# Altium footprint library Footprint.PcbLib: 137 footprints (part 1 of 9)
Each footprint in its own frame and in the unit in brackets; x right, y up, seen from the top. Pads: shape width x height; smd on the part's side, far side on the other; paste and mask are expansions set on the pad; w line width, h text height; cw(c..) or ccw(c..) is an arc to the next point about the centre after c.
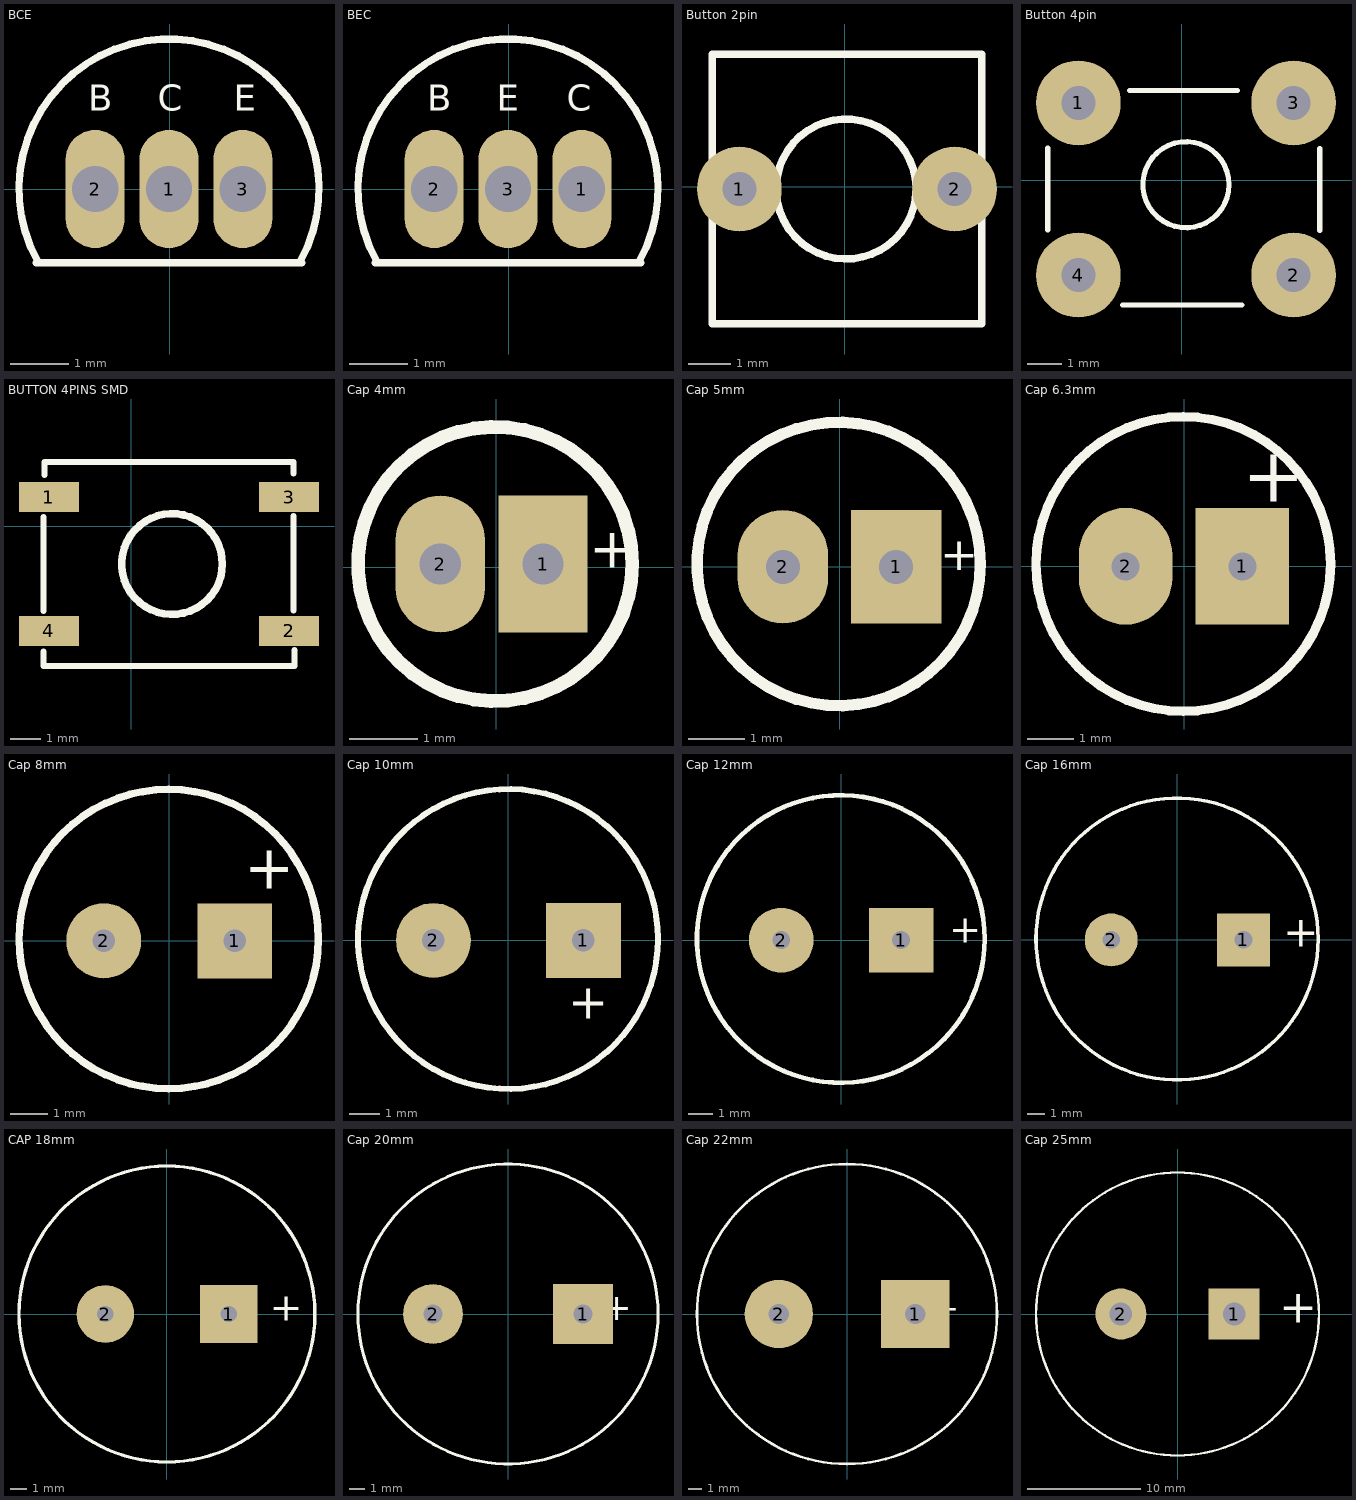
[diagram p0: the footprints below, top view; thin cyan lines are the x and y axes]

## BCE [mil] "Transistor BCE"
pads (3):
  oval 40x80 hole 31.49 unplated: 1(-0.39,0) 2(-50.39,0) 3(49.61,0)
Top Overlay:
  lines w5: -90.39,-50 89.61,-50 ; -89.34,-49.1 cw(c-0.39,0) 88.55,-49.1
  text "E" at 43.31,47.24 h30
  text "B" at -55.12,47.24 h30
  text "C" at -7.87,47.24 h30
3D body: height 196.85, standoff -39.37, extent -64.37,-10.78 -40.79,12.75
3D body: height 196.85, standoff -39.37, extent -13.19,-11.76 10.39,11.76
3D body: height 196.85, standoff -39.37, extent 36.02,-10.78 59.6,12.75
3D body: height 314.96, standoff 157.48, extent -89.96,-48.23 87.2,89.57

## BEC [mil] "Transistor BEC"
pads (3):
  oval 40x80 hole 31.49 unplated: 1(49.61,0) 2(-50.39,0) 3(-0.39,0)
Top Overlay:
  lines w5: -90.39,-50 89.61,-50 ; -89.34,-49.1 cw(c-0.39,0) 88.55,-49.1
  text "C" at 39.37,47.24 h30
  text "B" at -55.12,47.24 h30
  text "E" at -7.87,47.24 h30
3D body: height 314.96, standoff 157.48, extent -89.96,-48.23 87.2,89.57
3D body: height 196.85, standoff -39.37, extent 36.02,-10.78 59.6,12.75
3D body: height 196.85, standoff -39.37, extent -13.19,-11.76 10.39,11.76
3D body: height 196.85, standoff -39.37, extent -64.37,-10.78 -40.79,12.75

## Button 2pin [mm] "nut nhan 2pin"
pads (2):
  round 2 hole 0.8: 1(-2.489,-0.051) 2(2.591,-0.051)
Top Overlay:
  lines w0.178: 1.681,-0.051 cw(c0.03,-0.051) 1.68,-0.003 ; -3.124,-3.226 3.226,-3.226 3.226,3.124 -3.124,3.124 -3.124,-3.226
3D body "19977.stp": height 5, standoff -14, extent -2.95,-3.175 3.05,3.025

## Button 4pin [mm] "nut nhan 4pin"
pads (4):
  round 2.5 hole 1: 1(-3.048,2.286) 2(3.302,-2.794) 3(3.302,2.286) 4(-3.048,-2.794)
Top Overlay:
  circle w0.152: c0.127,-0.127 r1.27
  lines w0.152: -3.95,-1.463 -3.95,0.95 ; -1.737,-3.675 1.775,-3.675 ; -1.537,2.65 1.65,2.65 ; 4.075,-1.475 4.075,0.938
  lines w0.178: 3.023,-3.175 3.048,-3.15
3D body "SW3dPS-.STEP": height 7, standoff -3.5, extent -3.899,-3.633 4.001,2.567

## BUTTON 4PINS SMD [mil] "BUTTON 4PINS SMD PITCH=5MM"
pads (4):
  rect 78.74x39.37 smd: 1(-108,38) 2(208,-138) 3(208,38) 4(-108,-138)
Top Overlay:
  circle w10: c54,-50 r66.24
  lines w7.87: -115,-184 -115,-165 ; -115,-112 -115,12 ; -114,67 -114,84 214,84 214,69 ; -113,-184 215,-184 215,-163 ; 214,-111 214,13
3D body "User Library-TS-1150S-WP.step": height 196.85, standoff 0, extent -107.48,-177.95 207.48,77.95

## Cap 4mm [mm] "Cap d=4mm, pitch=1.5mm"
pads (2):
  rect 1.3x2 hole 0.6: 1(0.685,0.049)
  oval 1.3x2 hole 0.6: 2(-0.815,0.049)
Top Overlay:
  circle w0.2: c-0.015,0.049 r2
  text "+" at 1.36,-0.201 h1
3D body "User Library-Cap-EL(4x6-1_5)T.step": height 6.3, standoff -3.3, extent -2.002,-2 2,1.999

## Cap 5mm [mm] "Cap d=5mm, pitch=2mm"
pads (2):
  rect 1.6x2 hole 0.6: 1(1,0)
  oval 1.6x2 hole 0.6: 2(-1,0)
Top Overlay:
  circle w0.2: c-0.015,0.049 r2.5
  text "+" at 1.778,-0.254 h1
3D body "Cap Pol d=5mm, pitch=2mm.STEP": height 12.7, standoff -3.8, extent -2.75,-2.749 2.75,2.749

## Cap 6.3mm [mm] "Cap d=6.3mm, pitch=2.5mm"
pads (2):
  rect 2x2.5 hole 0.6: 1(1.25,0)
  oval 2x2.5 hole 0.6: 2(-1.25,0)
Top Overlay:
  circle w0.2: c-0.015,0.049 r3.15
  text "+" at 1.25,1 h2
3D body "User Library-CapAluRadial_D63H110.STEP": height 12.5, standoff -3, extent -3.4,-3.4 3.4,3.4

## Cap 8mm [mm] "Cap d=8mm, pitch=3.5mm"
pads (2):
  rect 2x2 hole 0.6: 1(1.75,0)
  round 2 hole 0.6: 2(-1.75,0)
Top Overlay:
  circle w0.2: c-0.015,0.049 r4
  text "+" at 2,1 h2
3D body "Cap Pol d=8mm, pitch=3.5mm.STEP": height 13, standoff -3, extent -4.25,-4.249 4.25,4.249

## Cap 10mm [mm] "Cap d=10mm, pitch=5mm"
pads (2):
  rect 2.5x2.5 hole 0.75: 1(2.5,0)
  round 2.5 hole 0.75: 2(-2.5,0)
Top Overlay:
  circle w0.2: c-0.015,0.049 r5
  text "+" at 2,-3 h2
3D body "User Library-JAMICON_TK_D(10)F(5)L(16).step": height 16.31, standoff -1.2, extent -5.01,-5 5,5

## Cap 12mm [mm] "Cap d=12mm, pitch=5mm"
pads (2):
  rect 2.7x2.7 hole 0.75: 1(2.5,0)
  round 2.7 hole 0.75: 2(-2.5,0)
Top Overlay:
  circle w0.2: c-0.015,0.049 r6
  text "+" at 4.5,-0.5 h2
3D body "User Library-JAMICON_TK_D(12_5)F(5)L(20).step": height 20.33, standoff -1.2, extent -6.28,-6.25 6.25,6.25

## Cap 16mm [mm] "Cap d=16mm, pitch=7.5mm"
pads (2):
  rect 3x3 hole 1: 1(3.75,0)
  round 3 hole 1: 2(-3.75,0)
Top Overlay:
  circle w0.2: c-0.015,0.049 r8
  text "+" at 6,-1 h3
3D body "User Library-CapAluRadial_D160H250.STEP": height 27, standoff -3, extent -8.25,-8.249 8.25,8.249

## CAP 18mm [mm] "Cap pol d=18mm, pitch=7.5mm"
pads (2):
  rect 3.5x3.5 hole 1: 1(3.75,0)
  round 3.5 hole 1: 2(-3.75,0)
Top Overlay:
  circle w0.2: c0,0 r9
  text "+" at 6.25,-1 h3
3D body "User Library-JAMICON_TK_D(18)F(7_5)L(40).step": height 40.03, standoff -1.5, extent -9,-9 9.03,9

## Cap 20mm [mm] "Cap pol d=20mm, pitch=10mm"
pads (2):
  rect 4x4 hole 1.3: 1(5,0)
  round 4 hole 1.3: 2(-5,0)
Top Overlay:
  circle w0.2: c0,0 r10
  text "+" at 6.25,-1 h3
3D body "User Library-JAMICON_TK_D(20)F(10)L(40).step": height 40.03, standoff -1.5, extent -10.045,-10 9.985,10

## Cap 22mm [mm] "Cap pol d=22mm, pitch=10mm"
pads (2):
  rect 5x5 hole 1.5: 1(5,0)
  round 5 hole 1.5: 2(-5,0)
Top Overlay:
  circle w0.2: c0,0 r11
  text "+" at 6.25,-1 h3
3D body "Cap Pol d=22mm, pitch=10mm.step": height 50.03, standoff -1.5, extent -11,-11 11.03,11

## Cap 25mm [mm] "Cap pol d=25mm, pitch=12.5mm"
pads (2):
  rect 4.5x4.5 hole 2: 1(5,0)
  round 4.5 hole 2: 2(-5,0)
Top Overlay:
  circle w0.2: c0,0 r12.5
  text "+" at 9,-1.75 h5
3D body "Cap Pol d=25mm, pitch=12.5mm.step": height 50.23, standoff -1.3, extent -12.53,-12.5 12.5,12.5